# Altium schematic symbol library SignalCommunications.SCHLIB: 804 symbols (part 5 of 9) (continued)
## WE-UNIT_74911810X (continued)

## WE-UNIT_74911811X
designator T?, comment <b>Off-Line Transformer WE-Unit</b><br><br> / - Nominal input voltage: 85-265 VAC<br> / - Output power 3 W <br> / - Operating temperature: -40°C to +125 °C<br> / - Clearance and creepage distance 6 mm min.<br> / - Isolation voltage 4 kVAC<br><br> / -- Designed for Tiny switch ICs from power integration and NCP101x or 105x of Semiconductor<br> / -- Universal input<br> / -- Offline-switch mode power supplies
footprint WE_E13/7/4_THT_HORIZONTAL_9PIN
pins: 1 3, 5 1, 6, 9 4

## WE-UNIT_74911820X
designator T?, comment <b>Off-Line Transformer WE-Unit</b><br><br> / - Nominal input voltage: 85-265 VAC<br> / - Output power 9 W <br> / - Operating temperature: -40°C to +125 °C<br> / - Clearance and creepage distance 6 mm min.<br> / - Isolation voltage 4 kVAC<br><br> / -- Designed for Tiny switch ICs from power integration and NCP101x or 105x of Semiconductor<br> / -- Universal input<br> / -- Offline-switch mode power supplies
footprint WE_E16/7/4_THT_VERTIKAL_10PIN
pins: 1, 2, 3, 4, 5, 6, 7, 8, 9, 10

## WE-UNIT_74911821X
designator T?, comment <b>Off-Line Transformer WE-Unit</b><br><br> / - Nominal input voltage: 85-265 VAC<br> / - Output power 9 W <br> / - Operating temperature: -40°C to +125 °C<br> / - Clearance and creepage distance 6 mm min.<br> / - Isolation voltage 4 kVAC<br><br> / -- Designed for Tiny switch ICs from power integration and NCP101x or 105x of Semiconductor<br> / -- Universal input<br> / -- Offline-switch mode power supplies
footprint WE_E16/8/5_THT_HORIZONTAL_9PIN
pins: 1 5, 2 4, 3, 4 2, 5 1, 6 9, 7 8, 8 7, 9 6

## WE-UNIT_NXP_750340505
designator T?, comment <b>Off-Line Transformer WE-Unit NXP</b><br><br> / - Nominal input voltage: 85-265 VAC<br> / - Operating temperature: -40°C to +125 °C<br> / - Isolation voltage 4 kVAC<br><br> / -- Especially designed for several ICs from NXP SSL2101<br> / -- Universal input<br> / -- Smart meters<br> / -- Dimmable 12 V LED driver<br> / -- Offline-switch mode power supplies
footprint WE_EFD25_THT_HORIZONTAL_10PIN
pins: 1, 2, 3, 4, 5, 6, 7, 8, 9, 10

## WE-UNIT_NXP_750841630
designator T?, comment <b>Off-Line Transformer WE-Unit NXP</b><br><br> / - Nominal input voltage: 85-265 VAC<br> / - Operating temperature: -40°C to +125 °C<br> / - Isolation voltage 4 kVAC<br><br> / -- Especially designed for several ICs from NXP TEA1522<br> / -- Universal input<br> / -- Smart meters<br> / -- Dimmable 12 V LED driver<br> / -- Offline-switch mode power supplies
footprint WE_EE20/10/6_THT_HORIZONTAL_14PIN
pins: 1, 2, 3, 4, 5, 6, 7, 8, 9, 10, 11, 12, 13, 14

## WE-UNIT_NXP_750871013
designator T?, comment <b>Off-Line Transformer WE-Unit NXP</b><br><br> / - Nominal input voltage: 85-265 VAC<br> / - Operating temperature: -40°C to +125 °C<br> / - Isolation voltage 4 kVAC<br><br> / -- Especially designed for several ICs from NXP TEA1521T<br> / -- Universal input<br> / -- Smart meters<br> / -- Dimmable 12 V LED driver<br> / -- Offline-switch mode power supplies
footprint WE_EE13/7/4_THT_HORIZONTAL_9PIN
pins: 1 5, 2 4, 3, 4 2, 5 1, 6 9, 7 8, 8 7, 9 6

## WE-UNIT_NXP_750871035
designator T?, comment <b>Off-Line Transformer WE-Unit NXP</b><br><br> / - Nominal input voltage: 85-265 VAC<br> / - Operating temperature: -40°C to +125 °C<br> / - Isolation voltage 4 kVAC<br><br> / -- Especially designed for several ICs from NXP TEA1522T<br> / -- Universal input<br> / -- Smart meters<br> / -- Dimmable 12 V LED driver<br> / -- Offline-switch mode power supplies
footprint WE_EE13/6/6_THT_HORIZONTAL_8PIN
pins: 1 4, 2 3, 3 2, 4 1, 5 8, 6 7, 7 6, 8 5

## WE-UNIT_NXP_750871530
designator T?, comment <b>Off-Line Transformer WE-Unit NXP</b><br><br> / - Nominal input voltage: 85-265 VAC<br> / - Operating temperature: -40°C to +125 °C<br> / - Isolation voltage 4 kVAC<br><br> / -- Especially designed for several ICs from NXP TEA1522<br> / -- Universal input<br> / -- Smart meters<br> / -- Dimmable 12 V LED driver<br> / -- Offline-switch mode power supplies
footprint WE_EE16/8/5_THT_HORIZONTAL_9PIN
pins: 1 5, 2 4, 3, 4 2, 5 1, 6 9, 7 8, 8 7, 9 6

## WE-UNIT_NXP_750871630
designator T?, comment <b>Off-Line Transformer WE-Unit NXP</b><br><br> / - Nominal input voltage: 85-265 VAC<br> / - Operating temperature: -40°C to +125 °C<br> / - Isolation voltage 4 kVAC<br><br> / -- Especially designed for several ICs from NXP TEA1623PH<br> / -- Universal input<br> / -- Smart meters<br> / -- Dimmable 12 V LED driver<br> / -- Offline-switch mode power supplies
footprint WE_EE20/10/6_THT_HORIZONTAL_14PIN
pins: 1, 2, 3, 4, 5, 6, 7, 8, 9, 10, 11, 12, 13, 14

## WE-UNIT_NXP_750871830
designator T?, comment <b>Off-Line Transformer WE-Unit NXP</b><br><br> / - Nominal input voltage: 85-265 VAC<br> / - Operating temperature: -40°C to +125 °C<br> / - Isolation voltage 4 kVAC<br><br> / -- Especially designed for several ICs from NXP TEA1523P<br> / -- Universal input<br> / -- Smart meters<br> / -- Dimmable 12 V LED driver<br> / -- Offline-switch mode power supplies
footprint WE_EE16/8/5_THT_HORIZONTAL_9PIN
pins: 1 5, 2 4, 3, 4 2, 5 1, 6 9, 7 8, 8 7, 9 6

## WE-UNIT_NXP_750871831
designator T?, comment <b>Off-Line Transformer WE-Unit NXP</b><br><br> / - Nominal input voltage: 85-265 VAC<br> / - Operating temperature: -40°C to +125 °C<br> / - Isolation voltage 4 kVAC<br><br> / -- Especially designed for several ICs from NXP TEA1623PH<br> / -- Universal input<br> / -- Smart meters<br> / -- Dimmable 12 V LED driver<br> / -- Offline-switch mode power supplies
footprint WE_EE25/13/7_THT_HORIZONTAL_13PIN
pins: 1, 2, 3, 4, 5, 6, 7, 8, 9, 10, 11, 12, 13

## WE-UNIT_PI_EE16/7/4
designator T?, comment <b>Off-Line Transformer WE-Unit PI</b><br><br> / - Nominal input voltage: 85-265 VAC<br> / - Output power 4.2 W <br> / - Operating temperature: -40°C to +125 °C<br> / - Clearance and creepage distance 6 mm min.<br> / - Isolation voltage 4 kVAC<br><br> / -- Especially designed for several ICs from Power Integrations LNK605<br> / -- Universal input<br> / -- Offline-switch mode power supplies
footprint WE_EE16/7/4_THT_HORIZONTAL_10PIN
pins: 1, 2, 3, 4, 5, 6, 7, 8, 9, 10

## WE-UNIT_PI_EE16/8/5
designator T?, comment <b>Off-Line Transformer WE-Unit PI</b><br><br> / - Nominal input voltage: 85-265 VAC<br> / - Output power from 2 W to 5 W <br> / - Operating temperature: -40°C to +125 °C<br> / - Clearance and creepage distance 6 mm min.<br> / - Isolation voltage 4 kVAC<br><br> / -- Especially designed for several ICs from Power Integrations<br> / -- Universal input<br> / -- Offline-switch mode power supplies
footprint WE_EE16/8/5_THT_HORIZONTAL_9PIN
pins: 1 5, 2 4, 3, 4 2, 5 1, 6 9, 7 8, 8 7, 9 6

## WE-UNIT_PI_EE20/10/6
designator T?, comment <b>Off-Line Transformer WE-Unit PI</b><br><br> / - Nominal input voltage: 85-265 VAC<br> / - Output power 12.0 W <br> / - Operating temperature: -40°C to +125 °C<br> / - Clearance and creepage distance 6 mm min.<br> / - Isolation voltage 4 kVAC<br><br> / -- Especially designed for several ICs from Power Integrations TNY278<br> / -- Universal input<br> / -- Offline-switch mode power supplies
footprint WE_EE20/10/6_THT_HORIZONTAL_14PIN
pins: 1, 2, 3, 4, 5, 6, 7, 8, 9, 10, 11, 12, 13, 14

## WE-UNIT_PI_EER28/4/11
designator T?, comment <b>Off-Line Transformer WE-Unit PI</b><br><br> / - Nominal input voltage: 85-265 VAC<br> / - Output power 34.4 W <br> / - Operating temperature: -40°C to +125 °C<br> / - Clearance and creepage distance 6 mm min.<br> / - Isolation voltage 4 kVAC<br><br> / -- Especially designed for several ICs from Power Integrations TOP258<br> / -- Universal input<br> / -- Offline-switch mode power supplies
footprint WE_EER28/4/11_HORIZONTAL_12PIN
pins: 1, 2, 3, 4, 5, 6, 7, 8, 9, 10, 11, 12

## WE-UNIT_STM_750310660
designator T?, comment <b>Off-Line Transformer WE-Unit STM</b><br><br> / - Nominal input voltage: 85-265 VAC<br> / - Operating temperature: -40°C to +125 °C<br> / - Isolation voltage 4 kVAC<br><br> / -- Especially designed for several ICs from STMicroelectronics VIPer 17H<br> / -- Universal input<br> / -- Offline-switch mode power supplies
footprint WE_EE16/8/5_THT_HORIZONTAL_6PIN
pins: 1 5, 4 6, 5 1, 6 2, 7 4, 8 3

## WE-UNIT_STM_750370024
designator T?, comment <b>Off-Line Transformer WE-Unit STM</b><br><br> / - Nominal input voltage: 85-265 VAC<br> / - Operating temperature: -40°C to +125 °C<br> / - Isolation voltage 4 kVAC<br><br> / -- Especially designed for several ICs from STMicroelectronics VIPer 17H<br> / -- Universal input<br> / -- Offline-switch mode power supplies
footprint WE_E13/7/4_THT_HORIZONTAL_9PIN
pins: 1, 3 2, 4, 5 3, 6 5, 9 6

## WE-UNIT_STM_750871110
designator T?, comment <b>Off-Line Transformer WE-Unit STM</b><br><br> / - Nominal input voltage: 85-265 VAC<br> / - Operating temperature: -40°C to +125 °C<br> / - Isolation voltage 4 kVAC<br><br> / -- Especially designed for several ICs from STMicroelectronics VIPer 28<br> / -- Universal input<br> / -- Offline-switch mode power supplies
footprint WE_EE20/10/6_THT_HORIZONTAL_14PIN_1
pins: 1 2, 3 1, 4, 6 3, 7 5, 9 6, 12 7, 14 8

## WE-UNIT_STM_750871111
designator T?, comment <b>Off-Line Transformer WE-Unit STM</b><br><br> / - Nominal input voltage: 85-265 VAC<br> / - Operating temperature: -40°C to +125 °C<br> / - Isolation voltage 4 kVAC<br><br> / -- Especially designed for several ICs from STMicroelectronics VIPer 27L<br> / -- Universal input<br> / -- Offline-switch mode power supplies
footprint WE_EE20/10/6_THT_HORIZONTAL_8PIN
pins: 1 2, 3 1, 4, 6 3, 7, 9 8, 12 5, 14 6

## WE-UNIT_STM_EE16/8/5_9PIN
designator T?, comment <b>Off-Line Transformer WE-Unit STM</b><br><br> / - Nominal input voltage: 85-265 VAC<br> / - Operating temperature: -40°C to +125 °C<br> / - Isolation voltage 4 kVAC<br><br> / -- Especially designed for several ICs from STMicroelectronics VIPer 17L and VIPer 15L<br> / -- Universal input<br> / -- Offline-switch mode power supplies
footprint WE_EE16/8/5_THT_HORIZONTAL_9PIN
pins: 1 2, 2 1, 4, 5 3, 6, 7 5, 8, 9 7

## WE-UOSTSCH-1
designator T?, comment <b>Universal Offline Standard Transformers WE-UOST</b><p> / - Approximate 1% stray inductance for symmetrical interference suppression<br> / <br> / -- Input voltage range 85-265VAC (125-375VDC)<br> / -- Output power 12-16W <br> / -- designed to comply with EN61558-2-16: reinforced insulation<br> / -- creepage and clearance distance > 6.5 mm <br> / --Insulation test voltage 4kV(AC)<br> / -- For SMD assembly <br>
MANUFACTURER: Würth Elektronik eiSos GmbH; CREATED-BY: Christin Otto; COMPANY-URL: http://www.we-online.de; CREATED-DATE: MAR 2013; DATASHEET-URL: http://katalog.we-online.de/en/pbs/WE-UOST?m=t&sq=uost&sp=&sp=http%3A%2F%2Fwww.we-online.de%2Fweb%2Fen%2Felectronic_components%2Fsearchpage_PBS.php%3Fsearch%3DUOST
footprint WE-UOST
pins: 1, 3, 4, 6, 7, 9, 11, 12

## WE-UOSTSCH-2
designator T?, comment <b>Universal Offline Standard Transformers WE-UOST</b><p> / - Approximate 1% stray inductance for symmetrical interference suppression<br> / <br> / -- Input voltage range 85-265VAC (125-375VDC)<br> / -- Output power 12-16W <br> / -- designed to comply with EN61558-2-16: reinforced insulation<br> / -- creepage and clearance distance > 6.5 mm <br> / --Insulation test voltage 4kV(AC)<br> / -- For SMD assembly <br>
MANUFACTURER: Würth Elektronik eiSos GmbH; CREATED-BY: Christin Zierenner; COMPANY-URL: http://www.we-online.de; CREATED-DATE: JAN 2013; DATASHEET-URL: http://katalog.we-online.de/en/pbs/WE-UOST?m=t&sq=uost&sp=&sp=http%3A%2F%2Fwww.we-online.de%2Fweb%2Fen%2Felectronic_components%2Fsearchpage_PBS.php%3Fsearch%3DUOST
footprint WE-UOST
pins: 1, 2 4, 3 4 3, 5 6 6, 7, 9, 11, 12

## WE-VD_5MM,820451111
designator D?, comment <b>Characteristics:</b> / <pre>•Low clamping voltage / •After a surge impulse the varistor works immediately / in normal mode so there is no slip current / •Excellent absorption at surge impulses</pre><br> / <b>Applications:</b> / <pre> / •12–48 VDC distribution / •110–400 V power supply / •Leakage of voltage peaks / •Surge protection in accordance with EN 61000-4-5 / </pre>
MANUFACTURER: Würth Elektronik eiSos GmbH; CREATED-BY: Christin Zierenner; COMPANY-URL: http://www.we-online.de; CREATED-DATE: May 2012; DATASHEET-URL: http://katalog.we-online.de/kataloge/eisos/index.php?language=en&pf=WE-VD
footprint WE-VD_5MM-DIA
pins: 1, 2

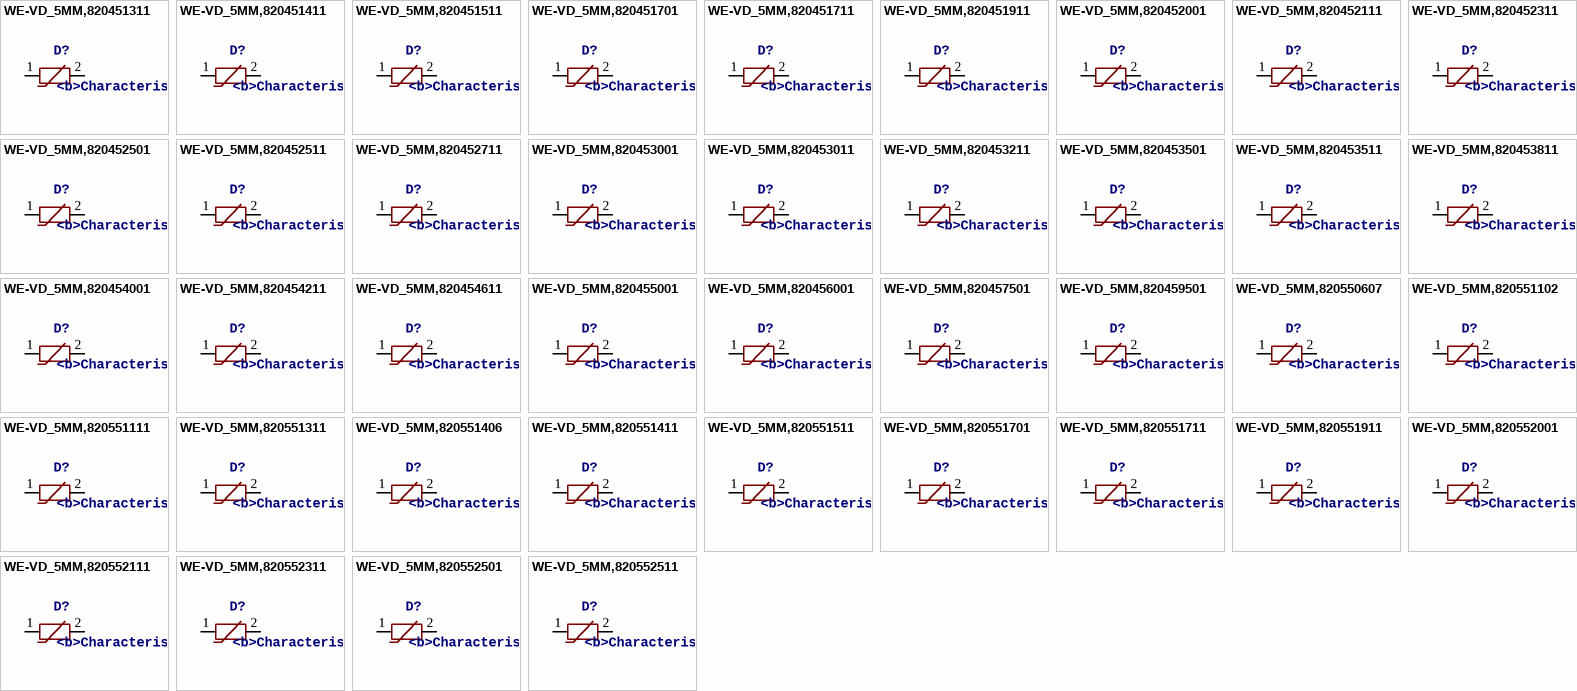
[diagram p34: symbols WE-VD_5MM,820451311 to WE-VD_5MM,820552511]

## WE-VD_5MM,820451311
designator D?, comment <b>Characteristics:</b> / <pre>•Low clamping voltage / •After a surge impulse the varistor works immediately / in normal mode so there is no slip current / •Excellent absorption at surge impulses</pre><br> / <b>Applications:</b> / <pre> / •12–48 VDC distribution / •110–400 V power supply / •Leakage of voltage peaks / •Surge protection in accordance with EN 61000-4-5 / </pre>
MANUFACTURER: Würth Elektronik eiSos GmbH; CREATED-BY: Christin Zierenner; COMPANY-URL: http://www.we-online.de; CREATED-DATE: May 2012; DATASHEET-URL: http://katalog.we-online.de/kataloge/eisos/index.php?language=en&pf=WE-VD
footprint WE-VD_5MM-DIA
pins: 1, 2

## WE-VD_5MM,820451411
designator D?, comment <b>Characteristics:</b> / <pre>•Low clamping voltage / •After a surge impulse the varistor works immediately / in normal mode so there is no slip current / •Excellent absorption at surge impulses</pre><br> / <b>Applications:</b> / <pre> / •12–48 VDC distribution / •110–400 V power supply / •Leakage of voltage peaks / •Surge protection in accordance with EN 61000-4-5 / </pre>
MANUFACTURER: Würth Elektronik eiSos GmbH; CREATED-BY: Christin Zierenner; COMPANY-URL: http://www.we-online.de; CREATED-DATE: May 2012; DATASHEET-URL: http://katalog.we-online.de/kataloge/eisos/index.php?language=en&pf=WE-VD
footprint WE-VD_5MM-DIA
pins: 1, 2

## WE-VD_5MM,820451511
designator D?, comment <b>Characteristics:</b> / <pre>•Low clamping voltage / •After a surge impulse the varistor works immediately / in normal mode so there is no slip current / •Excellent absorption at surge impulses</pre><br> / <b>Applications:</b> / <pre> / •12–48 VDC distribution / •110–400 V power supply / •Leakage of voltage peaks / •Surge protection in accordance with EN 61000-4-5 / </pre>
MANUFACTURER: Würth Elektronik eiSos GmbH; CREATED-BY: Christin Zierenner; COMPANY-URL: http://www.we-online.de; CREATED-DATE: May 2012; DATASHEET-URL: http://katalog.we-online.de/kataloge/eisos/index.php?language=en&pf=WE-VD
footprint WE-VD_5MM-DIA
pins: 1, 2

## WE-VD_5MM,820451701
designator D?, comment <b>Characteristics:</b> / <pre>•Low clamping voltage / •After a surge impulse the varistor works immediately / in normal mode so there is no slip current / •Excellent absorption at surge impulses</pre><br> / <b>Applications:</b> / <pre> / •12–48 VDC distribution / •110–400 V power supply / •Leakage of voltage peaks / •Surge protection in accordance with EN 61000-4-5 / </pre>
MANUFACTURER: Würth Elektronik eiSos GmbH; CREATED-BY: Christin Zierenner; COMPANY-URL: http://www.we-online.de; CREATED-DATE: May 2012; DATASHEET-URL: http://katalog.we-online.de/kataloge/eisos/index.php?language=en&pf=WE-VD
footprint WE-VD_5MM-DIA
pins: 1, 2

## WE-VD_5MM,820451711
designator D?, comment <b>Characteristics:</b> / <pre>•Low clamping voltage / •After a surge impulse the varistor works immediately / in normal mode so there is no slip current / •Excellent absorption at surge impulses</pre><br> / <b>Applications:</b> / <pre> / •12–48 VDC distribution / •110–400 V power supply / •Leakage of voltage peaks / •Surge protection in accordance with EN 61000-4-5 / </pre>
MANUFACTURER: Würth Elektronik eiSos GmbH; CREATED-BY: Christin Zierenner; COMPANY-URL: http://www.we-online.de; CREATED-DATE: May 2012; DATASHEET-URL: http://katalog.we-online.de/kataloge/eisos/index.php?language=en&pf=WE-VD
footprint WE-VD_5MM-DIA
pins: 1, 2

## WE-VD_5MM,820451911
designator D?, comment <b>Characteristics:</b> / <pre>•Low clamping voltage / •After a surge impulse the varistor works immediately / in normal mode so there is no slip current / •Excellent absorption at surge impulses</pre><br> / <b>Applications:</b> / <pre> / •12–48 VDC distribution / •110–400 V power supply / •Leakage of voltage peaks / •Surge protection in accordance with EN 61000-4-5 / </pre>
MANUFACTURER: Würth Elektronik eiSos GmbH; CREATED-BY: Christin Zierenner; COMPANY-URL: http://www.we-online.de; CREATED-DATE: May 2012; DATASHEET-URL: http://katalog.we-online.de/kataloge/eisos/index.php?language=en&pf=WE-VD
footprint WE-VD_5MM-DIA
pins: 1, 2

## WE-VD_5MM,820452001
designator D?, comment <b>Characteristics:</b> / <pre>•Low clamping voltage / •After a surge impulse the varistor works immediately / in normal mode so there is no slip current / •Excellent absorption at surge impulses</pre><br> / <b>Applications:</b> / <pre> / •12–48 VDC distribution / •110–400 V power supply / •Leakage of voltage peaks / •Surge protection in accordance with EN 61000-4-5 / </pre>
MANUFACTURER: Würth Elektronik eiSos GmbH; CREATED-BY: Christin Zierenner; COMPANY-URL: http://www.we-online.de; CREATED-DATE: May 2012; DATASHEET-URL: http://katalog.we-online.de/kataloge/eisos/media/pdf/820452001.pdf
footprint WE-VD_5MM-DIA
pins: 1, 2

## WE-VD_5MM,820452111
designator D?, comment <b>Characteristics:</b> / <pre>•Low clamping voltage / •After a surge impulse the varistor works immediately / in normal mode so there is no slip current / •Excellent absorption at surge impulses</pre><br> / <b>Applications:</b> / <pre> / •12–48 VDC distribution / •110–400 V power supply / •Leakage of voltage peaks / •Surge protection in accordance with EN 61000-4-5 / </pre>
MANUFACTURER: Würth Elektronik eiSos GmbH; CREATED-BY: Christin Zierenner; COMPANY-URL: http://www.we-online.de; CREATED-DATE: May 2012; DATASHEET-URL: http://katalog.we-online.de/kataloge/eisos/index.php?language=en&pf=WE-VD
footprint WE-VD_5MM-1.0
pins: 1, 2

## WE-VD_5MM,820452311
designator D?, comment <b>Characteristics:</b> / <pre>•Low clamping voltage / •After a surge impulse the varistor works immediately / in normal mode so there is no slip current / •Excellent absorption at surge impulses</pre><br> / <b>Applications:</b> / <pre> / •12–48 VDC distribution / •110–400 V power supply / •Leakage of voltage peaks / •Surge protection in accordance with EN 61000-4-5 / </pre>
MANUFACTURER: Würth Elektronik eiSos GmbH; CREATED-BY: Christin Zierenner; COMPANY-URL: http://www.we-online.de; CREATED-DATE: May 2012; DATASHEET-URL: http://katalog.we-online.de/kataloge/eisos/index.php?language=en&pf=WE-VD
footprint WE-VD_5MM-1.1
pins: 1, 2

## WE-VD_5MM,820452501
designator D?, comment <b>Characteristics:</b> / <pre>•Low clamping voltage / •After a surge impulse the varistor works immediately / in normal mode so there is no slip current / •Excellent absorption at surge impulses</pre><br> / <b>Applications:</b> / <pre> / •12–48 VDC distribution / •110–400 V power supply / •Leakage of voltage peaks / •Surge protection in accordance with EN 61000-4-5 / </pre>
MANUFACTURER: Würth Elektronik eiSos GmbH; CREATED-BY: Christin Zierenner; COMPANY-URL: http://www.we-online.de; CREATED-DATE: May 2012; DATASHEET-URL: http://katalog.we-online.de/kataloge/eisos/index.php?language=en&pf=WE-VD
footprint WE-VD_5MM-DIA
pins: 1, 2

## WE-VD_5MM,820452511
designator D?, comment <b>Characteristics:</b> / <pre>•Low clamping voltage / •After a surge impulse the varistor works immediately / in normal mode so there is no slip current / •Excellent absorption at surge impulses</pre><br> / <b>Applications:</b> / <pre> / •12–48 VDC distribution / •110–400 V power supply / •Leakage of voltage peaks / •Surge protection in accordance with EN 61000-4-5 / </pre>
MANUFACTURER: Würth Elektronik eiSos GmbH; CREATED-BY: Christin Zierenner; COMPANY-URL: http://www.we-online.de; CREATED-DATE: May 2012; DATASHEET-URL: http://katalog.we-online.de/kataloge/eisos/index.php?language=en&pf=WE-VD
footprint WE-VD_5MM-1.3
pins: 1, 2

## WE-VD_5MM,820452711
designator D?, comment <b>Characteristics:</b> / <pre>•Low clamping voltage / •After a surge impulse the varistor works immediately / in normal mode so there is no slip current / •Excellent absorption at surge impulses</pre><br> / <b>Applications:</b> / <pre> / •12–48 VDC distribution / •110–400 V power supply / •Leakage of voltage peaks / •Surge protection in accordance with EN 61000-4-5 / </pre>
MANUFACTURER: Würth Elektronik eiSos GmbH; CREATED-BY: Christin Zierenner; COMPANY-URL: http://www.we-online.de; CREATED-DATE: May 2012; DATASHEET-URL: http://katalog.we-online.de/kataloge/eisos/index.php?language=en&pf=WE-VD
footprint WE-VD_5MM-1.5
pins: 1, 2

## WE-VD_5MM,820453001
designator D?, comment <b>Characteristics:</b> / <pre>•Low clamping voltage / •After a surge impulse the varistor works immediately / in normal mode so there is no slip current / •Excellent absorption at surge impulses</pre><br> / <b>Applications:</b> / <pre> / •12–48 VDC distribution / •110–400 V power supply / •Leakage of voltage peaks / •Surge protection in accordance with EN 61000-4-5 / </pre>
MANUFACTURER: Würth Elektronik eiSos GmbH; CREATED-BY: Christin Zierenner; COMPANY-URL: http://www.we-online.de; CREATED-DATE: May 2012; DATASHEET-URL: http://katalog.we-online.de/kataloge/eisos/media/pdf/820453001.pdf
footprint WE-VD_5MM-DIA
pins: 1, 2

## WE-VD_5MM,820453011
designator D?, comment <b>Characteristics:</b> / <pre>•Low clamping voltage / •After a surge impulse the varistor works immediately / in normal mode so there is no slip current / •Excellent absorption at surge impulses</pre><br> / <b>Applications:</b> / <pre> / •12–48 VDC distribution / •110–400 V power supply / •Leakage of voltage peaks / •Surge protection in accordance with EN 61000-4-5 / </pre>
MANUFACTURER: Würth Elektronik eiSos GmbH; CREATED-BY: Christin Zierenner; COMPANY-URL: http://www.we-online.de; CREATED-DATE: May 2012; DATASHEET-URL: http://katalog.we-online.de/kataloge/eisos/index.php?language=en&pf=WE-VD
footprint WE-VD_5MM-1.7
pins: 1, 2

## WE-VD_5MM,820453211
designator D?, comment <b>Characteristics:</b> / <pre>•Low clamping voltage / •After a surge impulse the varistor works immediately / in normal mode so there is no slip current / •Excellent absorption at surge impulses</pre><br> / <b>Applications:</b> / <pre> / •12–48 VDC distribution / •110–400 V power supply / •Leakage of voltage peaks / •Surge protection in accordance with EN 61000-4-5 / </pre>
MANUFACTURER: Würth Elektronik eiSos GmbH; CREATED-BY: Christin Zierenner; COMPANY-URL: http://www.we-online.de; CREATED-DATE: May 2012; DATASHEET-URL: http://katalog.we-online.de/kataloge/eisos/index.php?language=en&pf=WE-VD
footprint WE-VD_5MM-1.8
pins: 1, 2

## WE-VD_5MM,820453501
designator D?, comment <b>Characteristics:</b> / <pre>•Low clamping voltage / •After a surge impulse the varistor works immediately / in normal mode so there is no slip current / •Excellent absorption at surge impulses</pre><br> / <b>Applications:</b> / <pre> / •12–48 VDC distribution / •110–400 V power supply / •Leakage of voltage peaks / •Surge protection in accordance with EN 61000-4-5 / </pre>
MANUFACTURER: Würth Elektronik eiSos GmbH; CREATED-BY: Christin Zierenner; COMPANY-URL: http://www.we-online.de; CREATED-DATE: May 2012; DATASHEET-URL: http://katalog.we-online.de/kataloge/eisos/index.php?language=en&pf=WE-VD
footprint WE-VD_5MM-1.1
pins: 1, 2

## WE-VD_5MM,820453511
designator D?, comment <b>Characteristics:</b> / <pre>•Low clamping voltage / •After a surge impulse the varistor works immediately / in normal mode so there is no slip current / •Excellent absorption at surge impulses</pre><br> / <b>Applications:</b> / <pre> / •12–48 VDC distribution / •110–400 V power supply / •Leakage of voltage peaks / •Surge protection in accordance with EN 61000-4-5 / </pre>
MANUFACTURER: Würth Elektronik eiSos GmbH; CREATED-BY: Christin Zierenner; COMPANY-URL: http://www.we-online.de; CREATED-DATE: May 2012; DATASHEET-URL: http://katalog.we-online.de/kataloge/eisos/index.php?language=en&pf=WE-VD
footprint WE-VD_5MM-2.1
pins: 1, 2

## WE-VD_5MM,820453811
designator D?, comment <b>Characteristics:</b> / <pre>•Low clamping voltage / •After a surge impulse the varistor works immediately / in normal mode so there is no slip current / •Excellent absorption at surge impulses</pre><br> / <b>Applications:</b> / <pre> / •12–48 VDC distribution / •110–400 V power supply / •Leakage of voltage peaks / •Surge protection in accordance with EN 61000-4-5 / </pre>
MANUFACTURER: Würth Elektronik eiSos GmbH; CREATED-BY: Christin Zierenner; COMPANY-URL: http://www.we-online.de; CREATED-DATE: May 2012; DATASHEET-URL: http://katalog.we-online.de/kataloge/eisos/media/pdf/820453811.pdf
footprint WE-VD_5MM-2.4
pins: 1, 2

## WE-VD_5MM,820454001
designator D?, comment <b>Characteristics:</b> / <pre>•Low clamping voltage / •After a surge impulse the varistor works immediately / in normal mode so there is no slip current / •Excellent absorption at surge impulses</pre><br> / <b>Applications:</b> / <pre> / •12–48 VDC distribution / •110–400 V power supply / •Leakage of voltage peaks / •Surge protection in accordance with EN 61000-4-5 / </pre>
MANUFACTURER: Würth Elektronik eiSos GmbH; CREATED-BY: Christin Zierenner; COMPANY-URL: http://www.we-online.de; CREATED-DATE: May 2012; DATASHEET-URL: http://katalog.we-online.de/kataloge/eisos/index.php?language=en&pf=WE-VD
footprint WE-VD_5MM-1.5
pins: 1, 2

## WE-VD_5MM,820454211
designator D?, comment <b>Characteristics:</b> / <pre>•Low clamping voltage / •After a surge impulse the varistor works immediately / in normal mode so there is no slip current / •Excellent absorption at surge impulses</pre><br> / <b>Applications:</b> / <pre> / •12–48 VDC distribution / •110–400 V power supply / •Leakage of voltage peaks / •Surge protection in accordance with EN 61000-4-5 / </pre>
MANUFACTURER: Würth Elektronik eiSos GmbH; CREATED-BY: Christin Zierenner; COMPANY-URL: http://www.we-online.de; CREATED-DATE: May 2012; DATASHEET-URL: http://katalog.we-online.de/kataloge/eisos/index.php?language=en&pf=WE-VD
footprint WE-VD_5MM-2.7
pins: 1, 2

## WE-VD_5MM,820454611
designator D?, comment <b>Characteristics:</b> / <pre>•Low clamping voltage / •After a surge impulse the varistor works immediately / in normal mode so there is no slip current / •Excellent absorption at surge impulses</pre><br> / <b>Applications:</b> / <pre> / •12–48 VDC distribution / •110–400 V power supply / •Leakage of voltage peaks / •Surge protection in accordance with EN 61000-4-5 / </pre>
MANUFACTURER: Würth Elektronik eiSos GmbH; CREATED-BY: Christin Zierenner; COMPANY-URL: http://www.we-online.de; CREATED-DATE: May 2012; DATASHEET-URL: http://katalog.we-online.de/kataloge/eisos/index.php?language=en&pf=WE-VD
footprint WE-VD_5MM-3.0
pins: 1, 2

## WE-VD_5MM,820455001
designator D?, comment <b>Characteristics:</b> / <pre>•Low clamping voltage / •After a surge impulse the varistor works immediately / in normal mode so there is no slip current / •Excellent absorption at surge impulses</pre><br> / <b>Applications:</b> / <pre> / •12–48 VDC distribution / •110–400 V power supply / •Leakage of voltage peaks / •Surge protection in accordance with EN 61000-4-5 / </pre>
MANUFACTURER: Würth Elektronik eiSos GmbH; CREATED-BY: Christin Zierenner; COMPANY-URL: http://www.we-online.de; CREATED-DATE: May 2012; DATASHEET-URL: http://katalog.we-online.de/kataloge/eisos/index.php?language=en&pf=WE-VD
footprint WE-VD_5MM-DIA
pins: 1, 2

## WE-VD_5MM,820456001
designator D?, comment <b>Characteristics:</b> / <pre>•Low clamping voltage / •After a surge impulse the varistor works immediately / in normal mode so there is no slip current / •Excellent absorption at surge impulses</pre><br> / <b>Applications:</b> / <pre> / •12–48 VDC distribution / •110–400 V power supply / •Leakage of voltage peaks / •Surge protection in accordance with EN 61000-4-5 / </pre>
MANUFACTURER: Würth Elektronik eiSos GmbH; CREATED-BY: Christin Zierenner; COMPANY-URL: http://www.we-online.de; CREATED-DATE: May 2012; DATASHEET-URL: http://katalog.we-online.de/kataloge/eisos/index.php?language=en&pf=WE-VD
footprint WE-VD_5MM-DIA
pins: 1, 2

## WE-VD_5MM,820457501
designator D?, comment <b>Characteristics:</b> / <pre>•Low clamping voltage / •After a surge impulse the varistor works immediately / in normal mode so there is no slip current / •Excellent absorption at surge impulses</pre><br> / <b>Applications:</b> / <pre> / •12–48 VDC distribution / •110–400 V power supply / •Leakage of voltage peaks / •Surge protection in accordance with EN 61000-4-5 / </pre>
MANUFACTURER: Würth Elektronik eiSos GmbH; CREATED-BY: Christin Zierenner; COMPANY-URL: http://www.we-online.de; CREATED-DATE: May 2012; DATASHEET-URL: http://katalog.we-online.de/kataloge/eisos/index.php?language=en&pf=WE-VD
footprint WE-VD_5MM-DIA
pins: 1, 2

## WE-VD_5MM,820459501
designator D?, comment <b>Characteristics:</b> / <pre>•Low clamping voltage / •After a surge impulse the varistor works immediately / in normal mode so there is no slip current / •Excellent absorption at surge impulses</pre><br> / <b>Applications:</b> / <pre> / •12–48 VDC distribution / •110–400 V power supply / •Leakage of voltage peaks / •Surge protection in accordance with EN 61000-4-5 / </pre>
MANUFACTURER: Würth Elektronik eiSos GmbH; CREATED-BY: Christin Zierenner; COMPANY-URL: http://www.we-online.de; CREATED-DATE: May 2012; DATASHEET-URL: http://katalog.we-online.de/kataloge/eisos/index.php?language=en&pf=WE-VD
footprint WE-VD_5MM-DIA
pins: 1, 2

## WE-VD_5MM,820550607
designator D?, comment <b>Characteristics:</b> / <pre>•Low clamping voltage / •After a surge impulse the varistor works immediately / in normal mode so there is no slip current / •Excellent absorption at surge impulses</pre><br> / <b>Applications:</b> / <pre> / •12–48 VDC distribution / •110–400 V power supply / •Leakage of voltage peaks / •Surge protection in accordance with EN 61000-4-5 / </pre>
MANUFACTURER: Würth Elektronik eiSos GmbH; CREATED-BY: Christin Zierenner; COMPANY-URL: http://www.we-online.de; CREATED-DATE: May 2012; DATASHEET-URL: http://katalog.we-online.de/kataloge/eisos/index.php?language=en&pf=WE-VD
footprint WE-VD_5MM-DIA
pins: 1, 2

## WE-VD_5MM,820551102
designator D?, comment <b>Characteristics:</b> / <pre>•Low clamping voltage / •After a surge impulse the varistor works immediately / in normal mode so there is no slip current / •Excellent absorption at surge impulses</pre><br> / <b>Applications:</b> / <pre> / •12–48 VDC distribution / •110–400 V power supply / •Leakage of voltage peaks / •Surge protection in accordance with EN 61000-4-5 / </pre>
MANUFACTURER: Würth Elektronik eiSos GmbH; CREATED-BY: Christin Zierenner; COMPANY-URL: http://www.we-online.de; CREATED-DATE: May 2012; DATASHEET-URL: http://katalog.we-online.de/kataloge/eisos/index.php?language=en&pf=WE-VD
footprint WE-VD_5MM-DIA
pins: 1, 2